# Altium footprint library bldc.PcbLib: 63 footprints (part 4 of 4)
Each footprint in its own frame and in the unit in brackets; x right, y up, seen from the top. Pads: shape width x height; smd on the part's side, far side on the other; paste and mask are expansions set on the pad; w line width, h text height; cw(c..) or ccw(c..) is an arc to the next point about the centre after c.
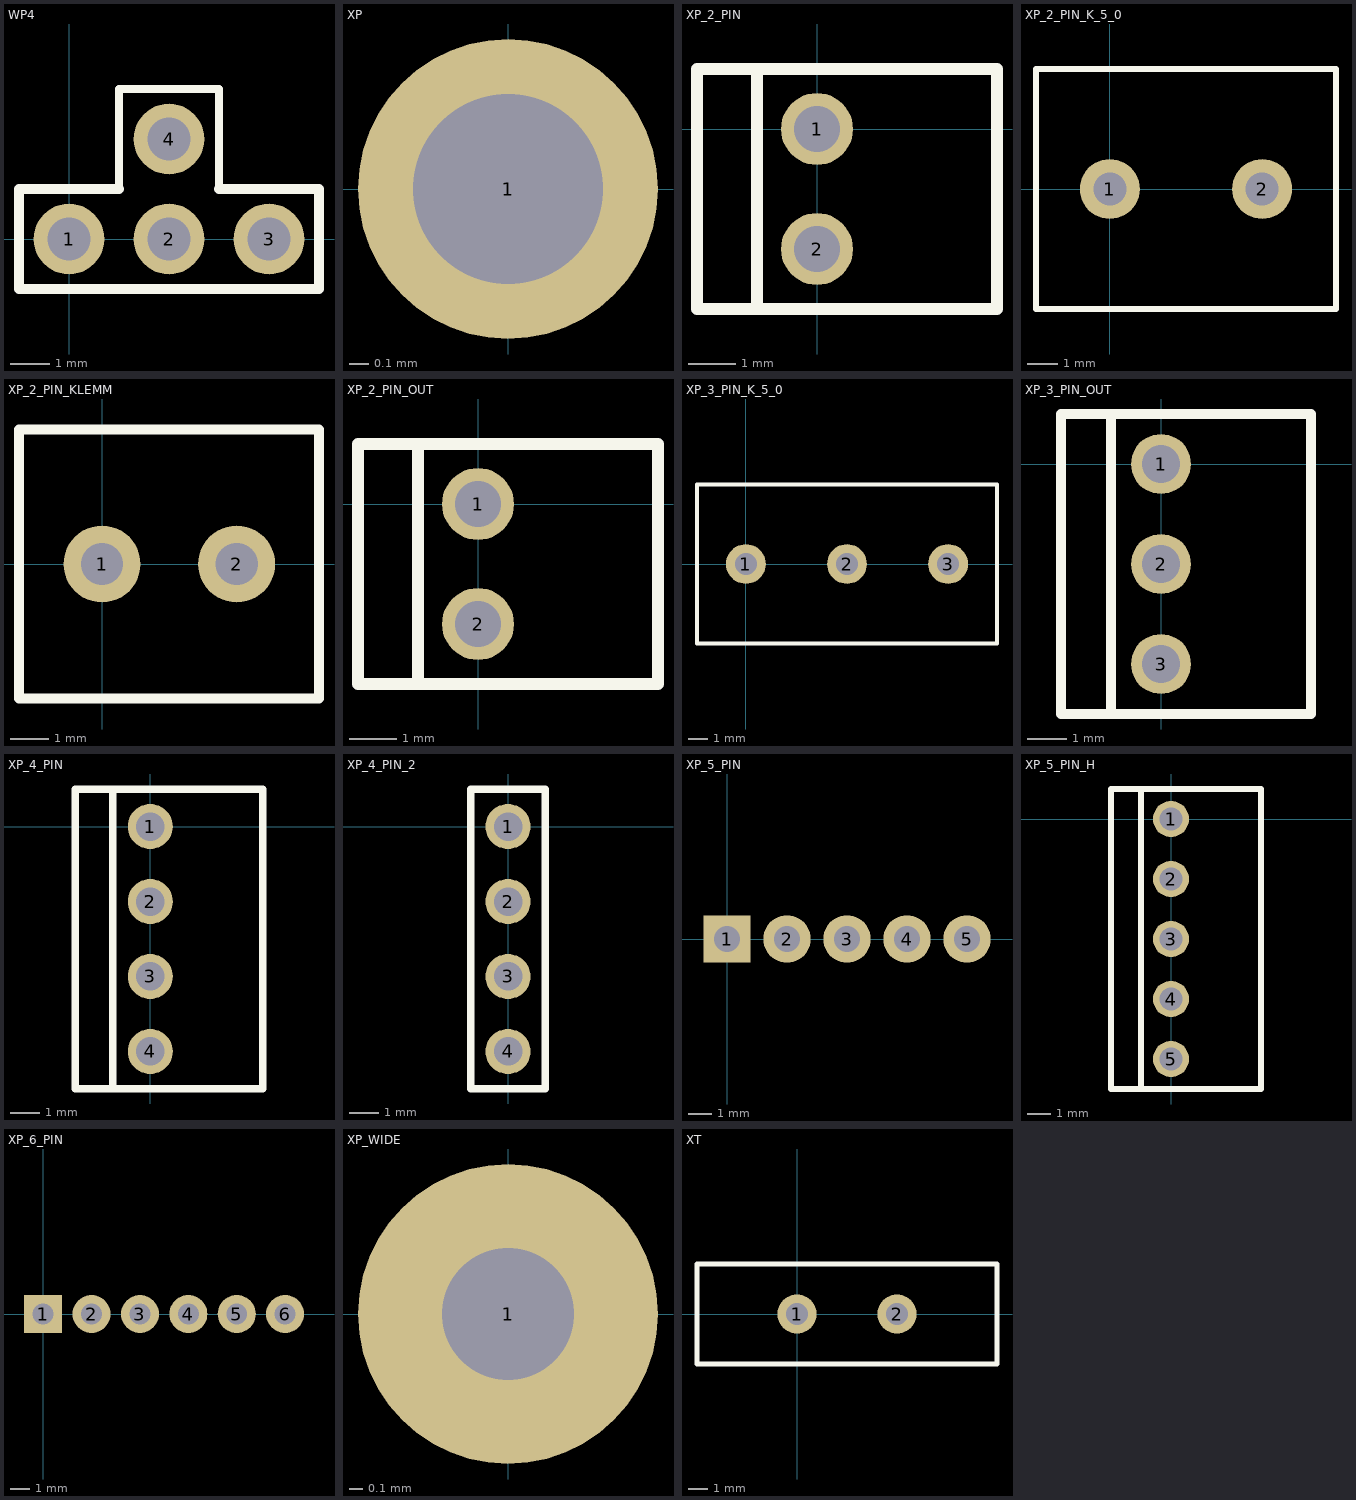
[diagram p3: the footprints below, top view; thin cyan lines are the x and y axes]

## WP4 [mm]
pads (4):
  round 1.8 hole 1.1: 1(0,0) 2(2.54,0) 3(5.08,0) 4(2.54,2.54)
Top Overlay:
  lines w0.2: 1.27,1.27 1.27,3.81 3.81,3.81 3.81,1.27
  lines w0.254: 1.27,1.27 -1.27,1.27 -1.27,-1.27 6.35,-1.27 6.35,1.27 3.81,1.27

## XP [mil]
pads (1):
  round 60 hole 38: 1(0,0)

## XP_2_PIN [mil]
pads (2):
  round 60 hole 38: 1(0,0) 2(0,-100)
Top Overlay:
  lines w10: -50,-150 -50,50 ; -100,-150 -100,50 150,50 150,-150 -100,-150

## XP_2_PIN_K_5_0 [mm]
pads (2):
  round 2 hole 1.1: 1(0,0) 2(5.08,0)
Top Overlay:
  lines w0.2: -2.46,-4 -2.46,4 7.54,4 7.54,-4 -2.46,-4

## XP_2_PIN_KLEMM [mm]
pads (2):
  round 2 hole 1.1: 1(0,0) 2(3.5,0)
Top Overlay:
  lines w0.254: -2.16,-3.5 5.64,-3.5 5.64,3.5 -2.16,3.5 -2.16,-3.5

## XP_2_PIN_OUT [mil]
pads (2):
  round 60 hole 38: 1(0,0) 2(0,-100)
Top Overlay:
  lines w10: -50,-150 -50,50 ; -100,-150 150,-150 150,50 -100,50 -100,-150

## XP_3_PIN_K_5_0 [mm]
pads (3):
  round 2 hole 1.1: 1(0,0) 2(5.08,0) 3(10.16,0)
Top Overlay:
  lines w0.2: 12.54,-4 -2.46,-4 -2.46,4 12.54,4 ; 12.62,-4 12.62,4

## XP_3_PIN_OUT [mil]
pads (3):
  round 60 hole 38: 1(0,0) 2(0,-100) 3(0,-200)
Top Overlay:
  lines w10: -50,-250 -50,50 ; -100,-250 -100,50 150,50 150,-250 -100,-250

## XP_4_PIN [mil]
pads (4):
  round 60 hole 38: 1(0,0) 2(0,-100) 3(0,-200) 4(0,-300)
Top Overlay:
  lines w10: -50,-350 -50,50 ; -100,-350 150,-350 150,50 -100,50 -100,-350

## XP_4_PIN_2 [mil]
pads (4):
  round 60 hole 38: 1(0,0) 2(0,-100) 3(0,-200) 4(0,-300)
Top Overlay:
  lines w10: -50,-350 -50,50 50,50 50,-350 -50,-350

## XP_5_PIN [mm]
pads (5):
  rect 2x2 hole 1.1: 1(0,0)
  round 2 hole 1.1: 2(2.54,0) 3(5.08,0) 4(7.62,0) 5(10.16,0)
Bottom Overlay:
  lines w0.254: -1.27,-1.27 -1.27,1.27 11.43,1.27 11.43,-1.27 -1.27,-1.27

## XP_5_PIN_H [mil]
pads (5):
  round 60 hole 38: 1(0,0) 2(0,-100) 3(0,-200) 4(0,-300) 5(0,-400)
Top Overlay:
  lines w10: -50,-450 -50,50 ; -100,-450 -100,50 150,50 150,-450 -100,-450

## XP_6_PIN [mm]
pads (6):
  rect 2x2 hole 1.1: 1(0,0)
  round 2 hole 1.1: 2(2.54,0) 3(5.08,0) 4(7.62,0) 5(10.16,0) 6(12.7,0)
Bottom Overlay:
  lines w0.254: -1.27,-1.27 14.478,-1.27 14.478,1.27 -1.27,1.27 -1.27,-1.27

## XP_WIDE [mm]
pads (1):
  round 2.2 hole 0.965: 1(0,0)

## XT [mm]
pads (2):
  round 2 hole 1.1: 1(0,0) 2(5.08,0)
Top Overlay:
  lines w0.254: -5.08,-2.54 10.16,-2.54 10.16,2.54 -5.08,2.54 -5.08,-2.54